# Altium footprint library sun_library.PcbLib: 412 footprints (part 9 of 26)
Each footprint in its own frame and in the unit in brackets; x right, y up, seen from the top. Pads: shape width x height; smd on the part's side, far side on the other; paste and mask are expansions set on the pad; w line width, h text height; cw(c..) or ccw(c..) is an arc to the next point about the centre after c.
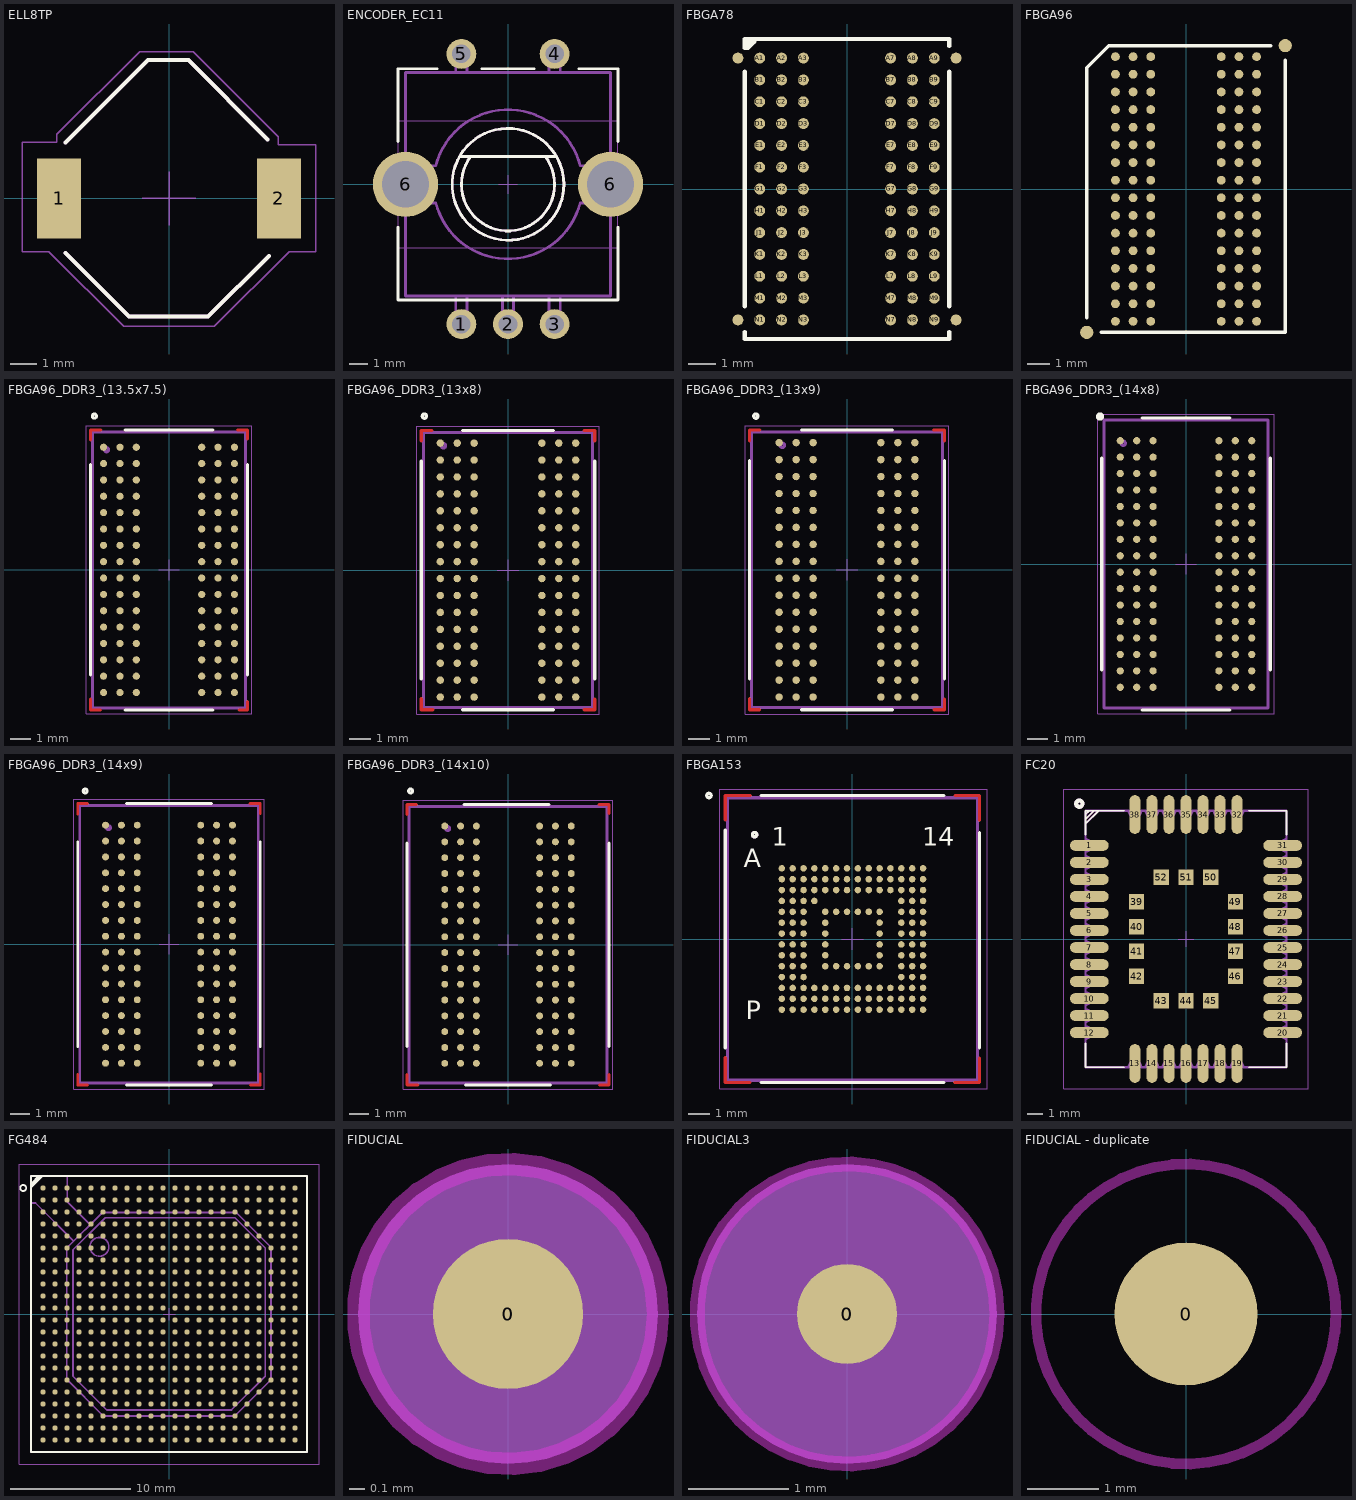
[diagram p8: the footprints below, top view; thin cyan lines are the x and y axes]

## ELL8TP [mm] "Shielded Wirewound Inductor, ELL8TP series, Panasonic"
height 4.7
pads (2):
  rect 1.65x3 smd: 1(-4.124,0) 2(4.124,0)
Top Overlay:
  lines w0.15: -3.889,-2.051 -1.503,-4.437 1.467,-4.437 3.748,-2.157 ; -3.889,2.086 -0.795,5.18 0.725,5.18 3.695,2.21
TopAssy 13:
  lines w0.15: -3.889,-2.051 -1.503,-4.437 1.467,-4.437 3.748,-2.157 ; -3.889,2.086 -0.795,5.18 0.725,5.18 3.695,2.21
CourtTop 15:
  lines w0.05: -1,0 1,0 ; 0,-1 0,1 ; -1.7,-4.8 1.7,-4.8 4.5,-2 5.5,-2 5.5,2 4.1,2 4.1,2.3 0.9,5.5 -1.1,5.5 -4.2,2.4 -4.2,2.1 -5.5,2.1 -5.5,-2 -4.5,-2 -1.7,-4.8 ; -1.7,-4.8 -1.7,-4.8
3D body "User Library-ELL8.step": height 4.84, standoff 0.09, extent -5.657,-5.657 5.657,5.657

## ENCODER_EC11 [mm]
pads (7):
  round 1.6 hole 1: 1(-2.5,-7.5) 2(0,-7.5) 3(2.5,-7.5) 4(2.5,7) 5(-2.5,7)
  round 3.5 hole 2.5: 6(-5.5,0) 6(5.5,0)
Top Overlay:
  circle w0.15: c0,0 r3
  lines w0.15: -5.9,-2.3 -5.9,-6.2 5.9,-6.2 5.9,-2.3 ; -5.9,2.3 -5.9,6.2 -3.8,6.2 ; -2.6,1.5 2.6,1.5 ; -2,1.5 ccw(c0,0) 2,1.5 ; -1.4,6.2 1.4,6.2 ; 3.8,6.2 5.9,6.2 5.9,2.3
TopAssy 13:
  circle w0.15: c0,0 r3
  lines w0.15: -5.1,-1 -5.1,1 ; -3.877,0.994 cw(c0,0.01) 3.877,0.994 ; -3.877,1 -5.5,1 -5.9,1 -5.9,-1 -5.5,-1 -3.875,-1 ; -3.875,-0.994 ccw(c0,0) 3.875,-0.994 ; -2.8,-6 -2.8,-7.7 -2.2,-7.7 -2.2,-6 ; -2.8,6 -2.8,7.2 -2.2,7.2 -2.2,6 ; -2.6,1.5 2.6,1.5 ; -2,1.5 ccw(c0,0) 2,1.5 ; -0.3,-6 -0.3,-7.7 0.3,-7.7 0.3,-6 ; 2.2,-6 2.2,-7.7 2.8,-7.7 2.8,-6 ; 2.2,6 2.2,7.2 2.8,7.2 2.8,6 ; 3.875,-1 5.5,-1 5.9,-1 5.9,1 5.5,1 3.877,1 ; 5.1,-1 5.1,1 ; -5.5,-6 5.5,-6 5.5,6 -5.5,6 -5.5,-6
CourtTop 15:
  lines w0.05: -0.5,0 0.5,0 ; 0,-0.5 0,0.5 ; -5.9,-3.4 -5.9,3.4 5.9,3.4 5.9,-3.4 -5.9,-3.4
3D body "User Library-EC11E-05SW.step": height 24.51, standoff -3.64, extent -5.856,-7.825 5.856,7.125

## FBGA78 [mm]
pads (82):
  round 0.4 smd mask+0.075: A1(-3.2,4.8) A2(-2.4,4.8) A3(-1.6,4.8) A7(1.6,4.8) A8(2.4,4.8) A9(3.2,4.8) B1(-3.2,4) B2(-2.4,4) B3(-1.6,4) B7(1.6,4) B8(2.4,4) B9(3.2,4) C1(-3.2,3.2) C2(-2.4,3.2) C3(-1.6,3.2) C7(1.6,3.2) C8(2.4,3.2) C9(3.2,3.2) D1(-3.2,2.4) D2(-2.4,2.4) D3(-1.6,2.4) D7(1.6,2.4) D8(2.4,2.4) D9(3.2,2.4) E1(-3.2,1.6) E2(-2.4,1.6) E3(-1.6,1.6) E7(1.6,1.6) E8(2.4,1.6) E9(3.2,1.6) F1(-3.2,0.8) F2(-2.4,0.8) F3(-1.6,0.8) F7(1.6,0.8) F8(2.4,0.8) F9(3.2,0.8) FID2(-4,-4.8) FID2(-4,4.8) FID2(4,-4.8) FID2(4,4.8) G1(-3.2,0) G2(-2.4,0) G3(-1.6,0) G7(1.6,0) G8(2.4,0) G9(3.2,0) H1(-3.2,-0.8) H2(-2.4,-0.8) H3(-1.6,-0.8) H7(1.6,-0.8) H8(2.4,-0.8) H9(3.2,-0.8) J1(-3.2,-1.6) J2(-2.4,-1.6) J3(-1.6,-1.6) J7(1.6,-1.6) J8(2.4,-1.6) J9(3.2,-1.6) K1(-3.2,-2.4) K2(-2.4,-2.4) K3(-1.6,-2.4) K7(1.6,-2.4) K8(2.4,-2.4) K9(3.2,-2.4) L1(-3.2,-3.2) L2(-2.4,-3.2) L3(-1.6,-3.2) L7(1.6,-3.2) L8(2.4,-3.2) L9(3.2,-3.2) M1(-3.2,-4) M2(-2.4,-4) M3(-1.6,-4) M7(1.6,-4) M8(2.4,-4) M9(3.2,-4) N1(-3.2,-4.8) N2(-2.4,-4.8) N3(-1.6,-4.8) N7(1.6,-4.8) N8(2.4,-4.8) N9(3.2,-4.8)
Top Overlay:
  lines w0.15: -3.75,-5.25 -3.75,-5.5 3.75,-5.5 3.75,-5.25 ; -3.75,-4.3 -3.75,4.3 ; -3.75,5.175 -3.625,5.175 -3.4,5.4 ; -3.55,5.45 -3.75,5.25 -3.75,5.5 3.75,5.5 3.75,5.25 ; 3.75,-4.3 3.75,4.3

## FBGA96 [mm]
pads (98):
  round 0.4 smd mask+0.075: A1(-3.2,6) A2(-2.4,6) A3(-1.6,6) A7(1.6,6) A8(2.4,6) A9(3.2,6) B1(-3.2,5.2) B2(-2.4,5.2) B3(-1.6,5.2) B7(1.6,5.2) B8(2.4,5.2) B9(3.2,5.2) C1(-3.2,4.4) C2(-2.4,4.4) C3(-1.6,4.4) C7(1.6,4.4) C8(2.4,4.4) C9(3.2,4.4) D1(-3.2,3.6) D2(-2.4,3.6) D3(-1.6,3.6) D7(1.6,3.6) D8(2.4,3.6) D9(3.2,3.6) E1(-3.2,2.8) E2(-2.4,2.8) E3(-1.6,2.8) E7(1.6,2.8) E8(2.4,2.8) E9(3.2,2.8) F1(-3.2,2) F2(-2.4,2) F3(-1.6,2) F7(1.6,2) F8(2.4,2) F9(3.2,2) G1(-3.2,1.2) G2(-2.4,1.2) G3(-1.6,1.2) G7(1.6,1.2) G8(2.4,1.2) G9(3.2,1.2) H1(-3.2,0.4) H2(-2.4,0.4) H3(-1.6,0.4) H7(1.6,0.4) H8(2.4,0.4) H9(3.2,0.4) J1(-3.2,-0.4) J2(-2.4,-0.4) J3(-1.6,-0.4) J7(1.6,-0.4) J8(2.4,-0.4) J9(3.2,-0.4) K1(-3.2,-1.2) K2(-2.4,-1.2) K3(-1.6,-1.2) K7(1.6,-1.2) K8(2.4,-1.2) K9(3.2,-1.2) L1(-3.2,-2) L2(-2.4,-2) L3(-1.6,-2) L7(1.6,-2) L8(2.4,-2) L9(3.2,-2) M1(-3.2,-2.8) M2(-2.4,-2.8) M3(-1.6,-2.8) M7(1.6,-2.8) M8(2.4,-2.8) M9(3.2,-2.8) N1(-3.2,-3.6) N2(-2.4,-3.6) N3(-1.6,-3.6) N7(1.6,-3.6) N8(2.4,-3.6) N9(3.2,-3.6) P1(-3.2,-4.4) P2(-2.4,-4.4) P3(-1.6,-4.4) P7(1.6,-4.4) P8(2.4,-4.4) P9(3.2,-4.4) R1(-3.2,-5.2) R2(-2.4,-5.2) R3(-1.6,-5.2) R7(1.6,-5.2) R8(2.4,-5.2) R9(3.2,-5.2) T1(-3.2,-6) T2(-2.4,-6) T3(-1.6,-6) T7(1.6,-6) T8(2.4,-6) T9(3.2,-6)
  round 0.6 smd mask+0.075: FID1(-4.5,-6.5) FID2(4.5,6.5)
Top Overlay:
  lines w0.15: -4.5,-5.85 -4.5,5.5 -3.5,6.5 3.85,6.5 ; -3.85,-6.5 4.5,-6.5 4.5,5.85

## FBGA96_DDR3_(13.5x7.5) [mm]
height 1.2
pads (96):
  round 0.35 smd mask+0.05: A1(-3.2,6) A2(-2.4,6) A3(-1.6,6) A7(1.6,6) A8(2.4,6) A9(3.2,6) B1(-3.2,5.2) B2(-2.4,5.2) B3(-1.6,5.2) B7(1.6,5.2) B8(2.4,5.2) B9(3.2,5.2) C1(-3.2,4.4) C2(-2.4,4.4) C3(-1.6,4.4) C7(1.6,4.4) C8(2.4,4.4) C9(3.2,4.4) D1(-3.2,3.6) D2(-2.4,3.6) D3(-1.6,3.6) D7(1.6,3.6) D8(2.4,3.6) D9(3.2,3.6) E1(-3.2,2.8) E2(-2.4,2.8) E3(-1.6,2.8) E7(1.6,2.8) E8(2.4,2.8) E9(3.2,2.8) F1(-3.2,2) F2(-2.4,2) F3(-1.6,2) F7(1.6,2) F8(2.4,2) F9(3.2,2) G1(-3.2,1.2) G2(-2.4,1.2) G3(-1.6,1.2) G7(1.6,1.2) G8(2.4,1.2) G9(3.2,1.2) H1(-3.2,0.4) H2(-2.4,0.4) H3(-1.6,0.4) H7(1.6,0.4) H8(2.4,0.4) H9(3.2,0.4) J1(-3.2,-0.4) J2(-2.4,-0.4) J3(-1.6,-0.4) J7(1.6,-0.4) J8(2.4,-0.4) J9(3.2,-0.4) K1(-3.2,-1.2) K2(-2.4,-1.2) K3(-1.6,-1.2) K7(1.6,-1.2) K8(2.4,-1.2) K9(3.2,-1.2) L1(-3.2,-2) L2(-2.4,-2) L3(-1.6,-2) L7(1.6,-2) L8(2.4,-2) L9(3.2,-2) M1(-3.2,-2.8) M2(-2.4,-2.8) M3(-1.6,-2.8) M7(1.6,-2.8) M8(2.4,-2.8) M9(3.2,-2.8) N1(-3.2,-3.6) N2(-2.4,-3.6) N3(-1.6,-3.6) N7(1.6,-3.6) N8(2.4,-3.6) N9(3.2,-3.6) P1(-3.2,-4.4) P2(-2.4,-4.4) P3(-1.6,-4.4) P7(1.6,-4.4) P8(2.4,-4.4) P9(3.2,-4.4) R1(-3.2,-5.2) R2(-2.4,-5.2) R3(-1.6,-5.2) R7(1.6,-5.2) R8(2.4,-5.2) R9(3.2,-5.2) T1(-3.2,-6) T2(-2.4,-6) T3(-1.6,-6) T7(1.6,-6) T8(2.4,-6) T9(3.2,-6)
Top:
  lines w0.15: -3.85,-6.325 -3.85,-6.85 -3.35,-6.85 ; -3.85,6.35 -3.85,6.85 -3.325,6.85 ; 3.35,6.85 3.85,6.85 3.85,6.4 ; 3.425,-6.85 3.85,-6.85 3.85,-6.45
Top Overlay:
  circle w0.15: c-3.65,7.525 r0.1
  lines w0.15: -3.85,-5.15 -3.85,5.15 ; -2.15,-6.85 2.15,-6.85 ; -2.15,6.85 2.15,6.85 ; 3.85,-5.15 3.85,5.15
TopAssy 13:
  circle w0.15: c-3.05,5.875 r0.1
  lines w0.15: -3.75,-6.75 -3.75,6.75 3.75,6.75 3.75,-6.75 -3.75,-6.75
CourtTop 15:
  lines w0.05: -0.5,0 0.5,0 ; 0,-0.5 0,0.5 ; -4.05,-7.05 4.05,-7.05 4.05,7.05 -4.05,7.05 -4.05,-7.05
Mechanical 29:
  text ".Designator" at -0.5,1.5 h1.52
3D body "BGA96.STEP": height 1.1, standoff -0.1, extent -3.75,-6.75 3.75,6.75

## FBGA96_DDR3_(13x8) [mm]
height 1.2
pads (96):
  round 0.35 smd mask+0.05: A1(-3.2,6) A2(-2.4,6) A3(-1.6,6) A7(1.6,6) A8(2.4,6) A9(3.2,6) B1(-3.2,5.2) B2(-2.4,5.2) B3(-1.6,5.2) B7(1.6,5.2) B8(2.4,5.2) B9(3.2,5.2) C1(-3.2,4.4) C2(-2.4,4.4) C3(-1.6,4.4) C7(1.6,4.4) C8(2.4,4.4) C9(3.2,4.4) D1(-3.2,3.6) D2(-2.4,3.6) D3(-1.6,3.6) D7(1.6,3.6) D8(2.4,3.6) D9(3.2,3.6) E1(-3.2,2.8) E2(-2.4,2.8) E3(-1.6,2.8) E7(1.6,2.8) E8(2.4,2.8) E9(3.2,2.8) F1(-3.2,2) F2(-2.4,2) F3(-1.6,2) F7(1.6,2) F8(2.4,2) F9(3.2,2) G1(-3.2,1.2) G2(-2.4,1.2) G3(-1.6,1.2) G7(1.6,1.2) G8(2.4,1.2) G9(3.2,1.2) H1(-3.2,0.4) H2(-2.4,0.4) H3(-1.6,0.4) H7(1.6,0.4) H8(2.4,0.4) H9(3.2,0.4) J1(-3.2,-0.4) J2(-2.4,-0.4) J3(-1.6,-0.4) J7(1.6,-0.4) J8(2.4,-0.4) J9(3.2,-0.4) K1(-3.2,-1.2) K2(-2.4,-1.2) K3(-1.6,-1.2) K7(1.6,-1.2) K8(2.4,-1.2) K9(3.2,-1.2) L1(-3.2,-2) L2(-2.4,-2) L3(-1.6,-2) L7(1.6,-2) L8(2.4,-2) L9(3.2,-2) M1(-3.2,-2.8) M2(-2.4,-2.8) M3(-1.6,-2.8) M7(1.6,-2.8) M8(2.4,-2.8) M9(3.2,-2.8) N1(-3.2,-3.6) N2(-2.4,-3.6) N3(-1.6,-3.6) N7(1.6,-3.6) N8(2.4,-3.6) N9(3.2,-3.6) P1(-3.2,-4.4) P2(-2.4,-4.4) P3(-1.6,-4.4) P7(1.6,-4.4) P8(2.4,-4.4) P9(3.2,-4.4) R1(-3.2,-5.2) R2(-2.4,-5.2) R3(-1.6,-5.2) R7(1.6,-5.2) R8(2.4,-5.2) R9(3.2,-5.2) T1(-3.2,-6) T2(-2.4,-6) T3(-1.6,-6) T7(1.6,-6) T8(2.4,-6) T9(3.2,-6)
Top:
  lines w0.15: -4.1,-6.075 -4.1,-6.6 -3.55,-6.6 ; -4.1,6.1 -4.1,6.6 -3.6,6.6 ; 3.6,-6.6 4.1,-6.6 4.1,-6.1 ; 3.6,6.6 4.1,6.6 4.1,6.1
Top Overlay:
  circle w0.15: c-3.95,7.275 r0.1
  lines w0.15: -4.1,-5.15 -4.1,5.15 ; -2.15,-6.6 2.15,-6.6 ; -2.15,6.6 2.15,6.6 ; 4.1,-5.15 4.1,5.15
TopAssy 13:
  circle w0.15: c-3.05,5.875 r0.1
  lines w0.15: -4,-6.5 -4,6.5 4,6.5 4,-6.5 -4,-6.5
CourtTop 15:
  lines w0.05: -0.5,0 0.5,0 ; 0,-0.5 0,0.5 ; -4.3,-6.8 4.3,-6.8 4.3,6.8 -4.3,6.8 -4.3,-6.8
Mechanical 29:
  text ".Designator" at -0.5,1.5 h1.52
3D body "BGA96CP80_16X9_1300X800X120B45.STEP": height 1.1, standoff -0.1, extent -4,-6.5 4,6.5

## FBGA96_DDR3_(13x9) [mm]
height 1.2
pads (96):
  round 0.35 smd mask+0.05: A1(-3.2,6) A2(-2.4,6) A3(-1.6,6) A7(1.6,6) A8(2.4,6) A9(3.2,6) B1(-3.2,5.2) B2(-2.4,5.2) B3(-1.6,5.2) B7(1.6,5.2) B8(2.4,5.2) B9(3.2,5.2) C1(-3.2,4.4) C2(-2.4,4.4) C3(-1.6,4.4) C7(1.6,4.4) C8(2.4,4.4) C9(3.2,4.4) D1(-3.2,3.6) D2(-2.4,3.6) D3(-1.6,3.6) D7(1.6,3.6) D8(2.4,3.6) D9(3.2,3.6) E1(-3.2,2.8) E2(-2.4,2.8) E3(-1.6,2.8) E7(1.6,2.8) E8(2.4,2.8) E9(3.2,2.8) F1(-3.2,2) F2(-2.4,2) F3(-1.6,2) F7(1.6,2) F8(2.4,2) F9(3.2,2) G1(-3.2,1.2) G2(-2.4,1.2) G3(-1.6,1.2) G7(1.6,1.2) G8(2.4,1.2) G9(3.2,1.2) H1(-3.2,0.4) H2(-2.4,0.4) H3(-1.6,0.4) H7(1.6,0.4) H8(2.4,0.4) H9(3.2,0.4) J1(-3.2,-0.4) J2(-2.4,-0.4) J3(-1.6,-0.4) J7(1.6,-0.4) J8(2.4,-0.4) J9(3.2,-0.4) K1(-3.2,-1.2) K2(-2.4,-1.2) K3(-1.6,-1.2) K7(1.6,-1.2) K8(2.4,-1.2) K9(3.2,-1.2) L1(-3.2,-2) L2(-2.4,-2) L3(-1.6,-2) L7(1.6,-2) L8(2.4,-2) L9(3.2,-2) M1(-3.2,-2.8) M2(-2.4,-2.8) M3(-1.6,-2.8) M7(1.6,-2.8) M8(2.4,-2.8) M9(3.2,-2.8) N1(-3.2,-3.6) N2(-2.4,-3.6) N3(-1.6,-3.6) N7(1.6,-3.6) N8(2.4,-3.6) N9(3.2,-3.6) P1(-3.2,-4.4) P2(-2.4,-4.4) P3(-1.6,-4.4) P7(1.6,-4.4) P8(2.4,-4.4) P9(3.2,-4.4) R1(-3.2,-5.2) R2(-2.4,-5.2) R3(-1.6,-5.2) R7(1.6,-5.2) R8(2.4,-5.2) R9(3.2,-5.2) T1(-3.2,-6) T2(-2.4,-6) T3(-1.6,-6) T7(1.6,-6) T8(2.4,-6) T9(3.2,-6)
Top:
  lines w0.15: -4.6,-6.075 -4.6,-6.6 -4.125,-6.6 ; -4.6,6.075 -4.6,6.6 -4.1,6.6 ; 4.075,6.6 4.6,6.6 4.6,6.075 ; 4.1,-6.6 4.6,-6.6 4.6,-6.1
Top Overlay:
  circle w0.15: c-4.3,7.25 r0.1
  lines w0.15: -4.6,-5.15 -4.6,5.15 ; -2.15,-6.6 2.15,-6.6 ; -2.15,6.6 2.15,6.6 ; 4.6,-5.15 4.6,5.15
TopAssy 13:
  circle w0.15: c-3.05,5.875 r0.1
  lines w0.15: -4.5,-6.5 -4.5,6.5 4.5,6.5 4.5,-6.5 -4.5,-6.5
CourtTop 15:
  lines w0.05: -0.5,0 0.5,0 ; 0,-0.5 0,0.5 ; -4.8,-6.8 4.8,-6.8 4.8,6.8 -4.8,6.8 -4.8,-6.8
Mechanical 29:
  text ".Designator" at -0.5,1.5 h1.52
3D body "BGA96CP80_16X9_1300X900X120B45.STEP": height 1.1, standoff -0.1, extent -4.5,-6.5 4.5,6.5

## FBGA96_DDR3_(14x8) [mm]
height 1.2
pads (96):
  round 0.35 smd mask+0.05: A1(-3.2,6) A2(-2.4,6) A3(-1.6,6) A7(1.6,6) A8(2.4,6) A9(3.2,6) B1(-3.2,5.2) B2(-2.4,5.2) B3(-1.6,5.2) B7(1.6,5.2) B8(2.4,5.2) B9(3.2,5.2) C1(-3.2,4.4) C2(-2.4,4.4) C3(-1.6,4.4) C7(1.6,4.4) C8(2.4,4.4) C9(3.2,4.4) D1(-3.2,3.6) D2(-2.4,3.6) D3(-1.6,3.6) D7(1.6,3.6) D8(2.4,3.6) D9(3.2,3.6) E1(-3.2,2.8) E2(-2.4,2.8) E3(-1.6,2.8) E7(1.6,2.8) E8(2.4,2.8) E9(3.2,2.8) F1(-3.2,2) F2(-2.4,2) F3(-1.6,2) F7(1.6,2) F8(2.4,2) F9(3.2,2) G1(-3.2,1.2) G2(-2.4,1.2) G3(-1.6,1.2) G7(1.6,1.2) G8(2.4,1.2) G9(3.2,1.2) H1(-3.2,0.4) H2(-2.4,0.4) H3(-1.6,0.4) H7(1.6,0.4) H8(2.4,0.4) H9(3.2,0.4) J1(-3.2,-0.4) J2(-2.4,-0.4) J3(-1.6,-0.4) J7(1.6,-0.4) J8(2.4,-0.4) J9(3.2,-0.4) K1(-3.2,-1.2) K2(-2.4,-1.2) K3(-1.6,-1.2) K7(1.6,-1.2) K8(2.4,-1.2) K9(3.2,-1.2) L1(-3.2,-2) L2(-2.4,-2) L3(-1.6,-2) L7(1.6,-2) L8(2.4,-2) L9(3.2,-2) M1(-3.2,-2.8) M2(-2.4,-2.8) M3(-1.6,-2.8) M7(1.6,-2.8) M8(2.4,-2.8) M9(3.2,-2.8) N1(-3.2,-3.6) N2(-2.4,-3.6) N3(-1.6,-3.6) N7(1.6,-3.6) N8(2.4,-3.6) N9(3.2,-3.6) P1(-3.2,-4.4) P2(-2.4,-4.4) P3(-1.6,-4.4) P7(1.6,-4.4) P8(2.4,-4.4) P9(3.2,-4.4) R1(-3.2,-5.2) R2(-2.4,-5.2) R3(-1.6,-5.2) R7(1.6,-5.2) R8(2.4,-5.2) R9(3.2,-5.2) T1(-3.2,-6) T2(-2.4,-6) T3(-1.6,-6) T7(1.6,-6) T8(2.4,-6) T9(3.2,-6)
Top Overlay:
  circle w0.2: c-4.182,7.174 r0.1
  lines w0.15: -4.1,-5.15 -4.1,5.15 ; -2.15,-7.1 2.15,-7.1 ; -2.15,7.1 2.15,7.1 ; 4.1,-5.15 4.1,5.15
TopAssy 13:
  circle w0.15: c-3.05,5.875 r0.1
  lines w0.15: -4,-7 4,-7 4,7 -4,7 -4,-7
CourtTop 15:
  lines w0.05: -0.5,0 0.5,0 ; 0,-0.5 0,0.5 ; -4.3,-7.3 -4.3,7.3 4.3,7.3 4.3,-7.3 -4.3,-7.3
Mechanical 29:
  text ".Designator" at -0.5,1.5 h1.52
3D body "BGA96CP80_16X9_1400X900X120B45.STEP": height 1.1, standoff -0.1, extent -4.5,-7 4.5,7

## FBGA96_DDR3_(14x9) [mm]
height 1.2
pads (96):
  round 0.35 smd mask+0.05: A1(-3.2,6) A2(-2.4,6) A3(-1.6,6) A7(1.6,6) A8(2.4,6) A9(3.2,6) B1(-3.2,5.2) B2(-2.4,5.2) B3(-1.6,5.2) B7(1.6,5.2) B8(2.4,5.2) B9(3.2,5.2) C1(-3.2,4.4) C2(-2.4,4.4) C3(-1.6,4.4) C7(1.6,4.4) C8(2.4,4.4) C9(3.2,4.4) D1(-3.2,3.6) D2(-2.4,3.6) D3(-1.6,3.6) D7(1.6,3.6) D8(2.4,3.6) D9(3.2,3.6) E1(-3.2,2.8) E2(-2.4,2.8) E3(-1.6,2.8) E7(1.6,2.8) E8(2.4,2.8) E9(3.2,2.8) F1(-3.2,2) F2(-2.4,2) F3(-1.6,2) F7(1.6,2) F8(2.4,2) F9(3.2,2) G1(-3.2,1.2) G2(-2.4,1.2) G3(-1.6,1.2) G7(1.6,1.2) G8(2.4,1.2) G9(3.2,1.2) H1(-3.2,0.4) H2(-2.4,0.4) H3(-1.6,0.4) H7(1.6,0.4) H8(2.4,0.4) H9(3.2,0.4) J1(-3.2,-0.4) J2(-2.4,-0.4) J3(-1.6,-0.4) J7(1.6,-0.4) J8(2.4,-0.4) J9(3.2,-0.4) K1(-3.2,-1.2) K2(-2.4,-1.2) K3(-1.6,-1.2) K7(1.6,-1.2) K8(2.4,-1.2) K9(3.2,-1.2) L1(-3.2,-2) L2(-2.4,-2) L3(-1.6,-2) L7(1.6,-2) L8(2.4,-2) L9(3.2,-2) M1(-3.2,-2.8) M2(-2.4,-2.8) M3(-1.6,-2.8) M7(1.6,-2.8) M8(2.4,-2.8) M9(3.2,-2.8) N1(-3.2,-3.6) N2(-2.4,-3.6) N3(-1.6,-3.6) N7(1.6,-3.6) N8(2.4,-3.6) N9(3.2,-3.6) P1(-3.2,-4.4) P2(-2.4,-4.4) P3(-1.6,-4.4) P7(1.6,-4.4) P8(2.4,-4.4) P9(3.2,-4.4) R1(-3.2,-5.2) R2(-2.4,-5.2) R3(-1.6,-5.2) R7(1.6,-5.2) R8(2.4,-5.2) R9(3.2,-5.2) T1(-3.2,-6) T2(-2.4,-6) T3(-1.6,-6) T7(1.6,-6) T8(2.4,-6) T9(3.2,-6)
Top:
  lines w0.15: -4.6,-6.575 -4.6,-7.1 -4.1,-7.1 ; -4.6,6.575 -4.6,7.1 -4.1,7.1 ; 4.075,7.1 4.6,7.1 4.6,6.6 ; 4.1,-7.1 4.6,-7.1 4.6,-6.55
Top Overlay:
  circle w0.15: c-4.225,7.725 r0.1
  lines w0.15: -4.6,-5.15 -4.6,5.15 ; -2.15,-7.1 2.15,-7.1 ; -2.15,7.1 2.15,7.1 ; 4.6,-5.15 4.6,5.15
TopAssy 13:
  circle w0.15: c-3.05,5.875 r0.1
  lines w0.15: -4.5,-7 -4.5,7 4.5,7 4.5,-7 -4.5,-7
CourtTop 15:
  lines w0.05: -0.5,0 0.5,0 ; 0,-0.5 0,0.5 ; -4.8,-7.3 4.8,-7.3 4.8,7.3 -4.8,7.3 -4.8,-7.3
Mechanical 29:
  text ".Designator" at -0.5,1.5 h1.52
3D body "BGA96CP80_16X9_1400X900X120B45.STEP": height 1.1, standoff -0.1, extent -4.5,-7 4.5,7

## FBGA96_DDR3_(14x10) [mm]
height 1.2
pads (96):
  round 0.35 smd mask+0.05: A1(-3.2,6) A2(-2.4,6) A3(-1.6,6) A7(1.6,6) A8(2.4,6) A9(3.2,6) B1(-3.2,5.2) B2(-2.4,5.2) B3(-1.6,5.2) B7(1.6,5.2) B8(2.4,5.2) B9(3.2,5.2) C1(-3.2,4.4) C2(-2.4,4.4) C3(-1.6,4.4) C7(1.6,4.4) C8(2.4,4.4) C9(3.2,4.4) D1(-3.2,3.6) D2(-2.4,3.6) D3(-1.6,3.6) D7(1.6,3.6) D8(2.4,3.6) D9(3.2,3.6) E1(-3.2,2.8) E2(-2.4,2.8) E3(-1.6,2.8) E7(1.6,2.8) E8(2.4,2.8) E9(3.2,2.8) F1(-3.2,2) F2(-2.4,2) F3(-1.6,2) F7(1.6,2) F8(2.4,2) F9(3.2,2) G1(-3.2,1.2) G2(-2.4,1.2) G3(-1.6,1.2) G7(1.6,1.2) G8(2.4,1.2) G9(3.2,1.2) H1(-3.2,0.4) H2(-2.4,0.4) H3(-1.6,0.4) H7(1.6,0.4) H8(2.4,0.4) H9(3.2,0.4) J1(-3.2,-0.4) J2(-2.4,-0.4) J3(-1.6,-0.4) J7(1.6,-0.4) J8(2.4,-0.4) J9(3.2,-0.4) K1(-3.2,-1.2) K2(-2.4,-1.2) K3(-1.6,-1.2) K7(1.6,-1.2) K8(2.4,-1.2) K9(3.2,-1.2) L1(-3.2,-2) L2(-2.4,-2) L3(-1.6,-2) L7(1.6,-2) L8(2.4,-2) L9(3.2,-2) M1(-3.2,-2.8) M2(-2.4,-2.8) M3(-1.6,-2.8) M7(1.6,-2.8) M8(2.4,-2.8) M9(3.2,-2.8) N1(-3.2,-3.6) N2(-2.4,-3.6) N3(-1.6,-3.6) N7(1.6,-3.6) N8(2.4,-3.6) N9(3.2,-3.6) P1(-3.2,-4.4) P2(-2.4,-4.4) P3(-1.6,-4.4) P7(1.6,-4.4) P8(2.4,-4.4) P9(3.2,-4.4) R1(-3.2,-5.2) R2(-2.4,-5.2) R3(-1.6,-5.2) R7(1.6,-5.2) R8(2.4,-5.2) R9(3.2,-5.2) T1(-3.2,-6) T2(-2.4,-6) T3(-1.6,-6) T7(1.6,-6) T8(2.4,-6) T9(3.2,-6)
Top:
  lines w0.15: -5.1,-6.575 -5.1,-7.1 -4.55,-7.1 ; -5.1,6.575 -5.1,7.1 -4.625,7.1 ; 4.6,7.1 5.1,7.1 5.1,6.625 ; 4.625,-7.1 5.1,-7.1 5.1,-6.575
Top Overlay:
  circle w0.15: c-4.925,7.775 r0.1
  lines w0.15: -5.1,-5.15 -5.1,5.15 ; -2.225,7.1 2.075,7.1 ; -2.15,-7.1 2.15,-7.1 ; 5.1,-5.15 5.1,5.15
TopAssy 13:
  circle w0.15: c-3.05,5.875 r0.1
  lines w0.15: -5,-7 -5,7 5,7 5,-7 -5,-7
CourtTop 15:
  lines w0.05: -0.5,0 0.5,0 ; 0,-0.5 0,0.5 ; -5.3,-7.3 5.3,-7.3 5.3,7.3 -5.3,7.3 -5.3,-7.3
Mechanical 29:
  text ".Designator" at -0.5,1.5 h1.52
3D body "BGA96CP80_16X9_1400X1000X120B45.STEP": height 1.1, standoff -0.1, extent -5,-7 5,7

## FBGA153 [mm] "153-Ball LFBGA – 11.5mm x 13.0mm x 1.4mm e.MMC™ Memory"
height 1.1
pads (153):
  round 0.3 smd mask+0.05: A1(-3.25,3.25) A2(-2.75,3.25) A3(-2.25,3.25) A4(-1.75,3.25) A5(-1.25,3.25) A6(-0.75,3.25) A7(-0.25,3.25) A8(0.25,3.25) A9(0.75,3.25) A10(1.25,3.25) A11(1.75,3.25) A12(2.25,3.25) A13(2.75,3.25) A14(3.25,3.25) B1(-3.25,2.75) B2(-2.75,2.75) B3(-2.25,2.75) B4(-1.75,2.75) B5(-1.25,2.75) B6(-0.75,2.75) B7(-0.25,2.75) B8(0.25,2.75) B9(0.75,2.75) B10(1.25,2.75) B11(1.75,2.75) B12(2.25,2.75) B13(2.75,2.75) B14(3.25,2.75) C1(-3.25,2.25) C2(-2.75,2.25) C3(-2.25,2.25) C4(-1.75,2.25) C5(-1.25,2.25) C6(-0.75,2.25) C7(-0.25,2.25) C8(0.25,2.25) C9(0.75,2.25) C10(1.25,2.25) C11(1.75,2.25) C12(2.25,2.25) C13(2.75,2.25) C14(3.25,2.25) D1(-3.25,1.75) D2(-2.75,1.75) D3(-2.25,1.75) D4(-1.75,1.75) D12(2.25,1.75) D13(2.75,1.75) D14(3.25,1.75) E1(-3.25,1.25) E2(-2.75,1.25) E3(-2.25,1.25) E5(-1.25,1.25) E6(-0.75,1.25) E7(-0.25,1.25) E8(0.25,1.25) E9(0.75,1.25) E10(1.25,1.25) E12(2.25,1.25) E13(2.75,1.25) E14(3.25,1.25) F1(-3.25,0.75) F2(-2.75,0.75) F3(-2.25,0.75) F5(-1.25,0.75) F10(1.25,0.75) F12(2.25,0.75) F13(2.75,0.75) F14(3.25,0.75) G1(-3.25,0.25) G2(-2.75,0.25) G3(-2.25,0.25) G5(-1.25,0.25) G10(1.25,0.25) G12(2.25,0.25) G13(2.75,0.25) G14(3.25,0.25) H1(-3.25,-0.25) H2(-2.75,-0.25) H3(-2.25,-0.25) H5(-1.25,-0.25) H10(1.25,-0.25) H12(2.25,-0.25) H13(2.75,-0.25) H14(3.25,-0.25) J1(-3.25,-0.75) J2(-2.75,-0.75) J3(-2.25,-0.75) J5(-1.25,-0.75) J10(1.25,-0.75) J12(2.25,-0.75) J13(2.75,-0.75) J14(3.25,-0.75) K1(-3.25,-1.25) K2(-2.75,-1.25) K3(-2.25,-1.25) K5(-1.25,-1.25) K6(-0.75,-1.25) K7(-0.25,-1.25) K8(0.25,-1.25) K9(0.75,-1.25) K10(1.25,-1.25) K12(2.25,-1.25) K13(2.75,-1.25) K14(3.25,-1.25) L1(-3.25,-1.75) L2(-2.75,-1.75) L3(-2.25,-1.75) L12(2.25,-1.75) L13(2.75,-1.75) L14(3.25,-1.75) M1(-3.25,-2.25) M2(-2.75,-2.25) M3(-2.25,-2.25) M4(-1.75,-2.25) M5(-1.25,-2.25) M6(-0.75,-2.25) M7(-0.25,-2.25) M8(0.25,-2.25) M9(0.75,-2.25) M10(1.25,-2.25) M11(1.75,-2.25) M12(2.25,-2.25) M13(2.75,-2.25) M14(3.25,-2.25) N1(-3.25,-2.75) N2(-2.75,-2.75) N3(-2.25,-2.75) N4(-1.75,-2.75) N5(-1.25,-2.75) N6(-0.75,-2.75) N7(-0.25,-2.75) N8(0.25,-2.75) N9(0.75,-2.75) N10(1.25,-2.75) N11(1.75,-2.75) N12(2.25,-2.75) N13(2.75,-2.75) N14(3.25,-2.75) P1(-3.25,-3.25) P2(-2.75,-3.25) P3(-2.25,-3.25) P4(-1.75,-3.25) P5(-1.25,-3.25) P6(-0.75,-3.25) P7(-0.25,-3.25) P8(0.25,-3.25) P9(0.75,-3.25) P10(1.25,-3.25) P11(1.75,-3.25) P12(2.25,-3.25) P13(2.75,-3.25) P14(3.25,-3.25)
Top:
  lines w0.15: -5.85,-5.45 -5.85,-6.6 -4.725,-6.6 ; -5.85,5.475 -5.85,6.6 -4.7,6.6 ; 4.7,-6.6 5.85,-6.6 5.85,-5.475 ; 4.725,6.6 5.85,6.6 5.85,5.45
Top Overlay:
  circle w0.15: c-6.6,6.6 r0.1
  circle w0.15: c-4.5,4.8 r0.1
  lines w0.15: -5.85,-5 -5.85,5 ; -4.2,-6.6 4.2,-6.6 ; -4.2,6.6 4.2,6.6 ; 5.85,-5 5.85,4.9
  text "14" at 3.2,4.3 h0.85
  text "1" at -3.7,4.3 h0.85
  text "P" at -4.9,-3.7 h0.85
  text "A" at -5,3.3 h0.85
TopAssy 13:
  circle w0.15: c-4.5,4.8 r0.1
  lines w0.15: -5.75,-6.5 5.75,-6.5 5.75,6.5 -5.75,6.5 -5.75,-6.5
  text "A" at -5,3.3 h0.96
  text "1" at -3.7,4.3 h0.96
CourtTop 15:
  lines w0.05: -0.5,0 0.5,0 ; 0,-0.5 0,0.5 ; -6.1,-6.9 6.2,-6.9 6.2,6.9 -6.1,6.9 -6.1,-6.9
3D body "User Library-153BallWFBGA.step": height 0.78, standoff -0.02, extent -5.75,-6.5 5.75,6.5

## FC20 [mm]
height 1.1
pads (52):
  oval 2.5x0.7 smd: 1(-6.25,6.05) 2(-6.25,4.95) 3(-6.25,3.85) 4(-6.25,2.75) 5(-6.25,1.65) 6(-6.25,0.55) 7(-6.25,-0.55) 8(-6.25,-1.65) 9(-6.25,-2.75) 10(-6.25,-3.85) 11(-6.25,-4.95) 12(-6.25,-6.05) 20(6.25,-6.05) 21(6.25,-4.95) 22(6.25,-3.85) 23(6.25,-2.75) 24(6.25,-1.65) 25(6.25,-0.55) 26(6.25,0.55) 27(6.25,1.65) 28(6.25,2.75) 29(6.25,3.85) 30(6.25,4.95) 31(6.25,6.05)
  oval 0.7x2.5 smd: 13(-3.3,-8.05) 14(-2.2,-8.05) 15(-1.1,-8.05) 16(0,-8.05) 17(1.1,-8.05) 18(2.2,-8.05) 19(3.3,-8.05) 32(3.3,8.05) 33(2.2,8.05) 34(1.1,8.05) 35(0,8.05) 36(-1.1,8.05) 37(-2.2,8.05) 38(-3.3,8.05)
  rect 1x1 smd: 39(-3.2,2.4) 40(-3.2,0.8) 41(-3.2,-0.8) 42(-3.2,-2.4) 43(-1.6,-4) 44(0,-4) 45(1.6,-4) 46(3.2,-2.4) 47(3.2,-0.8) 48(3.2,0.8) 49(3.2,2.4) 50(1.6,4) 51(0,4) 52(-1.6,4)
Top Overlay:
  circle w0.25: c-6.9,8.75 r0.206
  lines w0.1: -6.5,-6.75 -6.5,-8.3 -4,-8.3 ; -6.5,6.75 -6.5,8.3 -4,8.3 ; 4.05,-8.3 6.5,-8.3 6.5,-6.75 ; 4.05,8.3 6.5,8.3 6.5,6.75
  lines w0.102: -6.5,7.45 -5.65,8.3 ; -6.5,7.75 -5.95,8.3 ; -6.5,8.05 -6.25,8.3
TopAssy 13:
  circle w0.25: c-6.9,8.75 r0.206
  lines w0.15: -6.5,7.45 -5.65,8.3 ; -6.5,7.75 -5.95,8.3 ; -6.5,8.05 -6.25,8.3 ; -6.5,-8.3 -3.7,-8.3 cw(c-3.3,-8.3) -2.9,-8.3 -2.6,-8.3 cw(c-2.2,-8.3) -1.8,-8.3 -1.5,-8.3 cw(c-1.1,-8.3) -0.7,-8.3 -0.4,-8.3 cw(c0,-8.3) 0.4,-8.3 0.7,-8.3 cw(c1.1,-8.3) 1.5,-8.3 1.8,-8.3 cw(c2.2,-8.3) 2.6,-8.3 2.9,-8.3 cw(c3.3,-8.3) 3.7,-8.3 6.5,-8.3 6.5,-6.45 cw(c6.5,-6.05) 6.5,-5.65 6.5,-5.35 cw(c6.5,-4.95) 6.5,-4.55 6.5,-4.25 cw(c6.5,-3.85) 6.5,-3.45 6.5,-3.15 cw(c6.5,-2.75) 6.5,-2.35 6.5,-2.05 cw(c6.5,-1.65) 6.5,-1.25 6.5,-0.95 cw(c6.5,-0.55) 6.5,-0.15 6.5,0.15 cw(c6.5,0.55) 6.5,0.95 6.5,1.25 cw(c6.5,1.65) 6.5,2.05 6.5,2.35 cw(c6.5,2.75) 6.5,3.15 6.5,3.45 cw(c6.5,3.85) 6.5,4.25 6.5,4.55 cw(c6.5,4.95) 6.5,5.35 6.5,5.65 cw(c6.5,6.05) 6.5,6.45 6.5,8.3 3.7,8.3 cw(c3.3,8.3) 2.9,8.3 2.6,8.3 cw(c2.2,8.3) 1.8,8.3 1.5,8.3 cw(c1.1,8.3) 0.7,8.3 0.4,8.3 cw(c0,8.3) -0.4,8.3 -0.7,8.3 cw(c-1.1,8.3) -1.5,8.3 -1.8,8.3 cw(c-2.2,8.3) -2.6,8.3 -2.9,8.3 cw(c-3.3,8.3) -3.7,8.3 -6.5,8.3 -6.5,6.45 cw(c-6.5,6.05) -6.5,5.65 -6.5,5.35 cw(c-6.5,4.95) -6.5,4.55 -6.5,4.25 cw(c-6.5,3.85) -6.5,3.45 -6.5,3.15 cw(c-6.5,2.75) -6.5,2.35 -6.5,2.05 cw(c-6.5,1.65) -6.5,1.25 -6.5,0.95 cw(c-6.5,0.55) -6.5,0.15 -6.5,-0.15 cw(c-6.5,-0.55) -6.5,-0.95 -6.5,-1.25 cw(c-6.5,-1.65) -6.5,-2.05 -6.5,-2.35 cw(c-6.5,-2.75) -6.5,-3.15 -6.5,-3.45 cw(c-6.5,-3.85) -6.5,-4.25 -6.5,-4.55 cw(c-6.5,-4.95) -6.5,-5.35 -6.5,-5.65 cw(c-6.5,-6.05) -6.5,-6.45 -6.5,-8.3
CourtTop 15:
  lines w0.05: -0.5,0 0.5,0 ; 0,-0.5 0,0.5 ; -7.9,-9.7 7.9,-9.7 7.9,9.7 -7.9,9.7 -7.9,-9.7
3D body "LCC38P110_1660X1300X150L150X70N_2.STEP": height 1.5, standoff 0, extent -6.525,-8.325 6.475,8.275

## FG484 [mm] "BGA, 484-Leads, Body 23x23mm, Pitch 1mm"
height 2.6
pads (484):
  round 0.45 smd paste-0.025 mask+0.025: A1(-10.5,10.5) A2(-9.5,10.5) A3(-8.5,10.5) A4(-7.5,10.5) A5(-6.5,10.5) A6(-5.5,10.5) A7(-4.5,10.5) A8(-3.5,10.5) A9(-2.5,10.5) A10(-1.5,10.5) A11(-0.5,10.5) A12(0.5,10.5) A13(1.5,10.5) A14(2.5,10.5) A15(3.5,10.5) A16(4.5,10.5) A17(5.5,10.5) A18(6.5,10.5) A19(7.5,10.5) A20(8.5,10.5) A21(9.5,10.5) A22(10.5,10.5) AA1(-10.5,-9.5) AA2(-9.5,-9.5) AA3(-8.5,-9.5) AA4(-7.5,-9.5) AA5(-6.5,-9.5) AA6(-5.5,-9.5) AA7(-4.5,-9.5) AA8(-3.5,-9.5) AA9(-2.5,-9.5) AA10(-1.5,-9.5) AA11(-0.5,-9.5) AA12(0.5,-9.5) AA13(1.5,-9.5) AA14(2.5,-9.5) AA15(3.5,-9.5) AA16(4.5,-9.5) AA17(5.5,-9.5) AA18(6.5,-9.5) AA19(7.5,-9.5) AA20(8.5,-9.5) AA21(9.5,-9.5) AA22(10.5,-9.5) AB1(-10.5,-10.5) AB2(-9.5,-10.5) AB3(-8.5,-10.5) AB4(-7.5,-10.5) AB5(-6.5,-10.5) AB6(-5.5,-10.5) AB7(-4.5,-10.5) AB8(-3.5,-10.5) AB9(-2.5,-10.5) AB10(-1.5,-10.5) AB11(-0.5,-10.5) AB12(0.5,-10.5) AB13(1.5,-10.5) AB14(2.5,-10.5) AB15(3.5,-10.5) AB16(4.5,-10.5) AB17(5.5,-10.5) AB18(6.5,-10.5) AB19(7.5,-10.5) AB20(8.5,-10.5) AB21(9.5,-10.5) AB22(10.5,-10.5) B1(-10.5,9.5) B2(-9.5,9.5) B3(-8.5,9.5) B4(-7.5,9.5) B5(-6.5,9.5) B6(-5.5,9.5) B7(-4.5,9.5) B8(-3.5,9.5) B9(-2.5,9.5) B10(-1.5,9.5) B11(-0.5,9.5) B12(0.5,9.5) B13(1.5,9.5) B14(2.5,9.5) B15(3.5,9.5) B16(4.5,9.5) B17(5.5,9.5) B18(6.5,9.5) B19(7.5,9.5) B20(8.5,9.5) B21(9.5,9.5) B22(10.5,9.5) C1(-10.5,8.5) C2(-9.5,8.5) C3(-8.5,8.5) C4(-7.5,8.5) C5(-6.5,8.5) C6(-5.5,8.5) C7(-4.5,8.5) C8(-3.5,8.5) C9(-2.5,8.5) C10(-1.5,8.5) C11(-0.5,8.5) C12(0.5,8.5) C13(1.5,8.5) C14(2.5,8.5) C15(3.5,8.5) C16(4.5,8.5) C17(5.5,8.5) C18(6.5,8.5) C19(7.5,8.5) C20(8.5,8.5) C21(9.5,8.5) C22(10.5,8.5) D1(-10.5,7.5) D2(-9.5,7.5) D3(-8.5,7.5) D4(-7.5,7.5) D5(-6.5,7.5) D6(-5.5,7.5) D7(-4.5,7.5) D8(-3.5,7.5) D9(-2.5,7.5) D10(-1.5,7.5) D11(-0.5,7.5) D12(0.5,7.5) D13(1.5,7.5) D14(2.5,7.5) D15(3.5,7.5) D16(4.5,7.5) D17(5.5,7.5) D18(6.5,7.5) D19(7.5,7.5) D20(8.5,7.5) D21(9.5,7.5) D22(10.5,7.5) E1(-10.5,6.5) E2(-9.5,6.5) E3(-8.5,6.5) E4(-7.5,6.5) E5(-6.5,6.5) E6(-5.5,6.5) E7(-4.5,6.5) E8(-3.5,6.5) E9(-2.5,6.5) E10(-1.5,6.5) E11(-0.5,6.5) E12(0.5,6.5) E13(1.5,6.5) E14(2.5,6.5) E15(3.5,6.5) E16(4.5,6.5) E17(5.5,6.5) E18(6.5,6.5) E19(7.5,6.5) E20(8.5,6.5) E21(9.5,6.5) E22(10.5,6.5) F1(-10.5,5.5) F2(-9.5,5.5) F3(-8.5,5.5) F4(-7.5,5.5) F5(-6.5,5.5) F6(-5.5,5.5) F7(-4.5,5.5) F8(-3.5,5.5) F9(-2.5,5.5) F10(-1.5,5.5) F11(-0.5,5.5) F12(0.5,5.5) F13(1.5,5.5) F14(2.5,5.5) F15(3.5,5.5) F16(4.5,5.5) F17(5.5,5.5) F18(6.5,5.5) F19(7.5,5.5) F20(8.5,5.5) F21(9.5,5.5) F22(10.5,5.5) G1(-10.5,4.5) G2(-9.5,4.5) G3(-8.5,4.5) G4(-7.5,4.5) G5(-6.5,4.5) G6(-5.5,4.5) G7(-4.5,4.5) G8(-3.5,4.5) G9(-2.5,4.5) G10(-1.5,4.5) G11(-0.5,4.5) G12(0.5,4.5) G13(1.5,4.5) G14(2.5,4.5) G15(3.5,4.5) G16(4.5,4.5) G17(5.5,4.5) G18(6.5,4.5) G19(7.5,4.5) G20(8.5,4.5) G21(9.5,4.5) G22(10.5,4.5) H1(-10.5,3.5) H2(-9.5,3.5) H3(-8.5,3.5) H4(-7.5,3.5) H5(-6.5,3.5) H6(-5.5,3.5) H7(-4.5,3.5) H8(-3.5,3.5) H9(-2.5,3.5) H10(-1.5,3.5) H11(-0.5,3.5) H12(0.5,3.5) H13(1.5,3.5) H14(2.5,3.5) H15(3.5,3.5) H16(4.5,3.5) H17(5.5,3.5) H18(6.5,3.5) H19(7.5,3.5) H20(8.5,3.5) H21(9.5,3.5) H22(10.5,3.5) J1(-10.5,2.5) J2(-9.5,2.5) J3(-8.5,2.5) J4(-7.5,2.5) J5(-6.5,2.5) J6(-5.5,2.5) J7(-4.5,2.5) J8(-3.5,2.5) J9(-2.5,2.5) J10(-1.5,2.5) J11(-0.5,2.5) J12(0.5,2.5) J13(1.5,2.5) J14(2.5,2.5) J15(3.5,2.5) J16(4.5,2.5) J17(5.5,2.5) J18(6.5,2.5) J19(7.5,2.5) J20(8.5,2.5) J21(9.5,2.5) J22(10.5,2.5) K1(-10.5,1.5) K2(-9.5,1.5) K3(-8.5,1.5) K4(-7.5,1.5) K5(-6.5,1.5) K6(-5.5,1.5) K7(-4.5,1.5) K8(-3.5,1.5) K9(-2.5,1.5) K10(-1.5,1.5) K11(-0.5,1.5) K12(0.5,1.5) K13(1.5,1.5) K14(2.5,1.5) K15(3.5,1.5) K16(4.5,1.5) K17(5.5,1.5) K18(6.5,1.5) K19(7.5,1.5) K20(8.5,1.5) K21(9.5,1.5) K22(10.5,1.5) L1(-10.5,0.5) L2(-9.5,0.5) L3(-8.5,0.5) L4(-7.5,0.5) L5(-6.5,0.5) L6(-5.5,0.5) L7(-4.5,0.5) L8(-3.5,0.5) L9(-2.5,0.5) L10(-1.5,0.5) L11(-0.5,0.5) L12(0.5,0.5) L13(1.5,0.5) L14(2.5,0.5) L15(3.5,0.5) L16(4.5,0.5) L17(5.5,0.5) L18(6.5,0.5) L19(7.5,0.5) L20(8.5,0.5) L21(9.5,0.5) L22(10.5,0.5) M1(-10.5,-0.5) M2(-9.5,-0.5) M3(-8.5,-0.5) M4(-7.5,-0.5) M5(-6.5,-0.5) M6(-5.5,-0.5) M7(-4.5,-0.5) M8(-3.5,-0.5) M9(-2.5,-0.5) M10(-1.5,-0.5) M11(-0.5,-0.5) M12(0.5,-0.5) M13(1.5,-0.5) M14(2.5,-0.5) M15(3.5,-0.5) M16(4.5,-0.5) M17(5.5,-0.5) M18(6.5,-0.5) M19(7.5,-0.5) M20(8.5,-0.5) M21(9.5,-0.5) M22(10.5,-0.5) N1(-10.5,-1.5) N2(-9.5,-1.5) N3(-8.5,-1.5) N4(-7.5,-1.5) N5(-6.5,-1.5) N6(-5.5,-1.5) N7(-4.5,-1.5) N8(-3.5,-1.5) N9(-2.5,-1.5) N10(-1.5,-1.5) N11(-0.5,-1.5) N12(0.5,-1.5) N13(1.5,-1.5) N14(2.5,-1.5) N15(3.5,-1.5) N16(4.5,-1.5) N17(5.5,-1.5) N18(6.5,-1.5) N19(7.5,-1.5) N20(8.5,-1.5) N21(9.5,-1.5) N22(10.5,-1.5) P1(-10.5,-2.5) P2(-9.5,-2.5) P3(-8.5,-2.5) P4(-7.5,-2.5) P5(-6.5,-2.5) P6(-5.5,-2.5) P7(-4.5,-2.5) P8(-3.5,-2.5) P9(-2.5,-2.5) P10(-1.5,-2.5) P11(-0.5,-2.5) P12(0.5,-2.5) P13(1.5,-2.5) P14(2.5,-2.5) P15(3.5,-2.5) P16(4.5,-2.5) P17(5.5,-2.5) P18(6.5,-2.5) P19(7.5,-2.5) P20(8.5,-2.5) P21(9.5,-2.5) P22(10.5,-2.5) R1(-10.5,-3.5) R2(-9.5,-3.5) R3(-8.5,-3.5) R4(-7.5,-3.5) R5(-6.5,-3.5) R6(-5.5,-3.5) R7(-4.5,-3.5) R8(-3.5,-3.5) R9(-2.5,-3.5) R10(-1.5,-3.5) R11(-0.5,-3.5) R12(0.5,-3.5) R13(1.5,-3.5) R14(2.5,-3.5) R15(3.5,-3.5) R16(4.5,-3.5) R17(5.5,-3.5) R18(6.5,-3.5) R19(7.5,-3.5) R20(8.5,-3.5) R21(9.5,-3.5) R22(10.5,-3.5) T1(-10.5,-4.5) T2(-9.5,-4.5) T3(-8.5,-4.5) T4(-7.5,-4.5) T5(-6.5,-4.5) T6(-5.5,-4.5) T7(-4.5,-4.5) T8(-3.5,-4.5) T9(-2.5,-4.5) T10(-1.5,-4.5) T11(-0.5,-4.5) T12(0.5,-4.5) T13(1.5,-4.5) T14(2.5,-4.5) T15(3.5,-4.5) T16(4.5,-4.5) T17(5.5,-4.5) T18(6.5,-4.5) T19(7.5,-4.5) T20(8.5,-4.5) T21(9.5,-4.5) T22(10.5,-4.5) U1(-10.5,-5.5) U2(-9.5,-5.5) U3(-8.5,-5.5) U4(-7.5,-5.5) U5(-6.5,-5.5) U6(-5.5,-5.5) U7(-4.5,-5.5) U8(-3.5,-5.5) U9(-2.5,-5.5) U10(-1.5,-5.5) U11(-0.5,-5.5) U12(0.5,-5.5) U13(1.5,-5.5) U14(2.5,-5.5) U15(3.5,-5.5) U16(4.5,-5.5) U17(5.5,-5.5) U18(6.5,-5.5) U19(7.5,-5.5) U20(8.5,-5.5) U21(9.5,-5.5) U22(10.5,-5.5) V1(-10.5,-6.5) V2(-9.5,-6.5) V3(-8.5,-6.5) V4(-7.5,-6.5) V5(-6.5,-6.5) V6(-5.5,-6.5) V7(-4.5,-6.5) V8(-3.5,-6.5) V9(-2.5,-6.5) V10(-1.5,-6.5) V11(-0.5,-6.5) V12(0.5,-6.5) V13(1.5,-6.5) V14(2.5,-6.5) V15(3.5,-6.5) V16(4.5,-6.5) V17(5.5,-6.5) V18(6.5,-6.5) V19(7.5,-6.5) V20(8.5,-6.5) V21(9.5,-6.5) V22(10.5,-6.5) W1(-10.5,-7.5) W2(-9.5,-7.5) W3(-8.5,-7.5) W4(-7.5,-7.5) W5(-6.5,-7.5) W6(-5.5,-7.5) W7(-4.5,-7.5) W8(-3.5,-7.5) W9(-2.5,-7.5) W10(-1.5,-7.5) W11(-0.5,-7.5) W12(0.5,-7.5) W13(1.5,-7.5) W14(2.5,-7.5) W15(3.5,-7.5) W16(4.5,-7.5) W17(5.5,-7.5) W18(6.5,-7.5) W19(7.5,-7.5) W20(8.5,-7.5) W21(9.5,-7.5) W22(10.5,-7.5) Y1(-10.5,-8.5) Y2(-9.5,-8.5) Y3(-8.5,-8.5) Y4(-7.5,-8.5) Y5(-6.5,-8.5) Y6(-5.5,-8.5) Y7(-4.5,-8.5) Y8(-3.5,-8.5) Y9(-2.5,-8.5) Y10(-1.5,-8.5) Y11(-0.5,-8.5) Y12(0.5,-8.5) Y13(1.5,-8.5) Y14(2.5,-8.5) Y15(3.5,-8.5) Y16(4.5,-8.5) Y17(5.5,-8.5) Y18(6.5,-8.5) Y19(7.5,-8.5) Y20(8.5,-8.5) Y21(9.5,-8.5) Y22(10.5,-8.5)
Top Overlay:
  circle w0.15: c-12.15,10.5 r0.25
  region: -10.5,11.5 -11.5,10.5 -11.5,10.925 -10.925,11.5
  lines w0.15: -11.5,10.5 -10.5,11.5 ; -11.5,-11.5 -11.5,11.5 11.5,11.5 11.5,-11.5 -11.5,-11.5
TopAssy 13:
  circle w0.15: c-5.8,5.6 r0.785
  lines w0.15: -11.5,9.25 -11.125,9.25 -7.975,6.1 ; -8.475,11.475 -8.475,9.35 -6.6,7.475 ; -11.5,-11.5 11.5,-11.5 11.5,11.5 -11.5,11.5 -11.5,-11.5 ; -8.525,-5.45 -8.525,5.5 -5.575,8.45 5.625,8.45 8.5,5.575 8.5,-5.475 5.475,-8.5 -5.475,-8.5 -8.525,-5.45 ; -8,-5.175 -5.175,-8 5.2,-8 8.025,-5.175 8.025,5.5 5.5,8.025 -5.325,8.025 -8,5.35 -8,-5.175
CourtTop 15:
  lines w0.05: -0.5,0 0.5,0 ; 0,-0.5 0,0.5 ; -12.5,-12.5 12.5,-12.5 12.5,12.5 -12.5,12.5 -12.5,-12.5
3D body "User Library-FBGA484.step": height 2.5, standoff 0, extent -11.5,-11.5 11.5,11.5

## FIDUCIAL [mm] "Fidicular Mark"
pads (2):
  round 1 smd paste-0.5 mask+0.5: 0(0,0)
  round 2 on Mech13 mask+1: 0(0,0)
Top keep-out:
  circle w0.15: c0,0 r1

## FIDUCIAL3 [mm] "Fidicular Mark"
pads (2):
  round 1 smd paste-0.5 mask+1: 0(0,0)
  round 3 on Mech13 mask+1: 0(0,0)
Top keep-out:
  circle w0.15: c0,0 r1.5

## FIDUCIAL - duplicate [mm] "Fidicular Mark"
pads (1):
  round 2 smd mask+1: 0(0,0)
Top keep-out:
  circle w0.15: c0,0 r2.1